# Altium integrated library 基地库.IntLib: 127 symbols
Pins are listed as number, name and electrical type; pins without a type are passive.

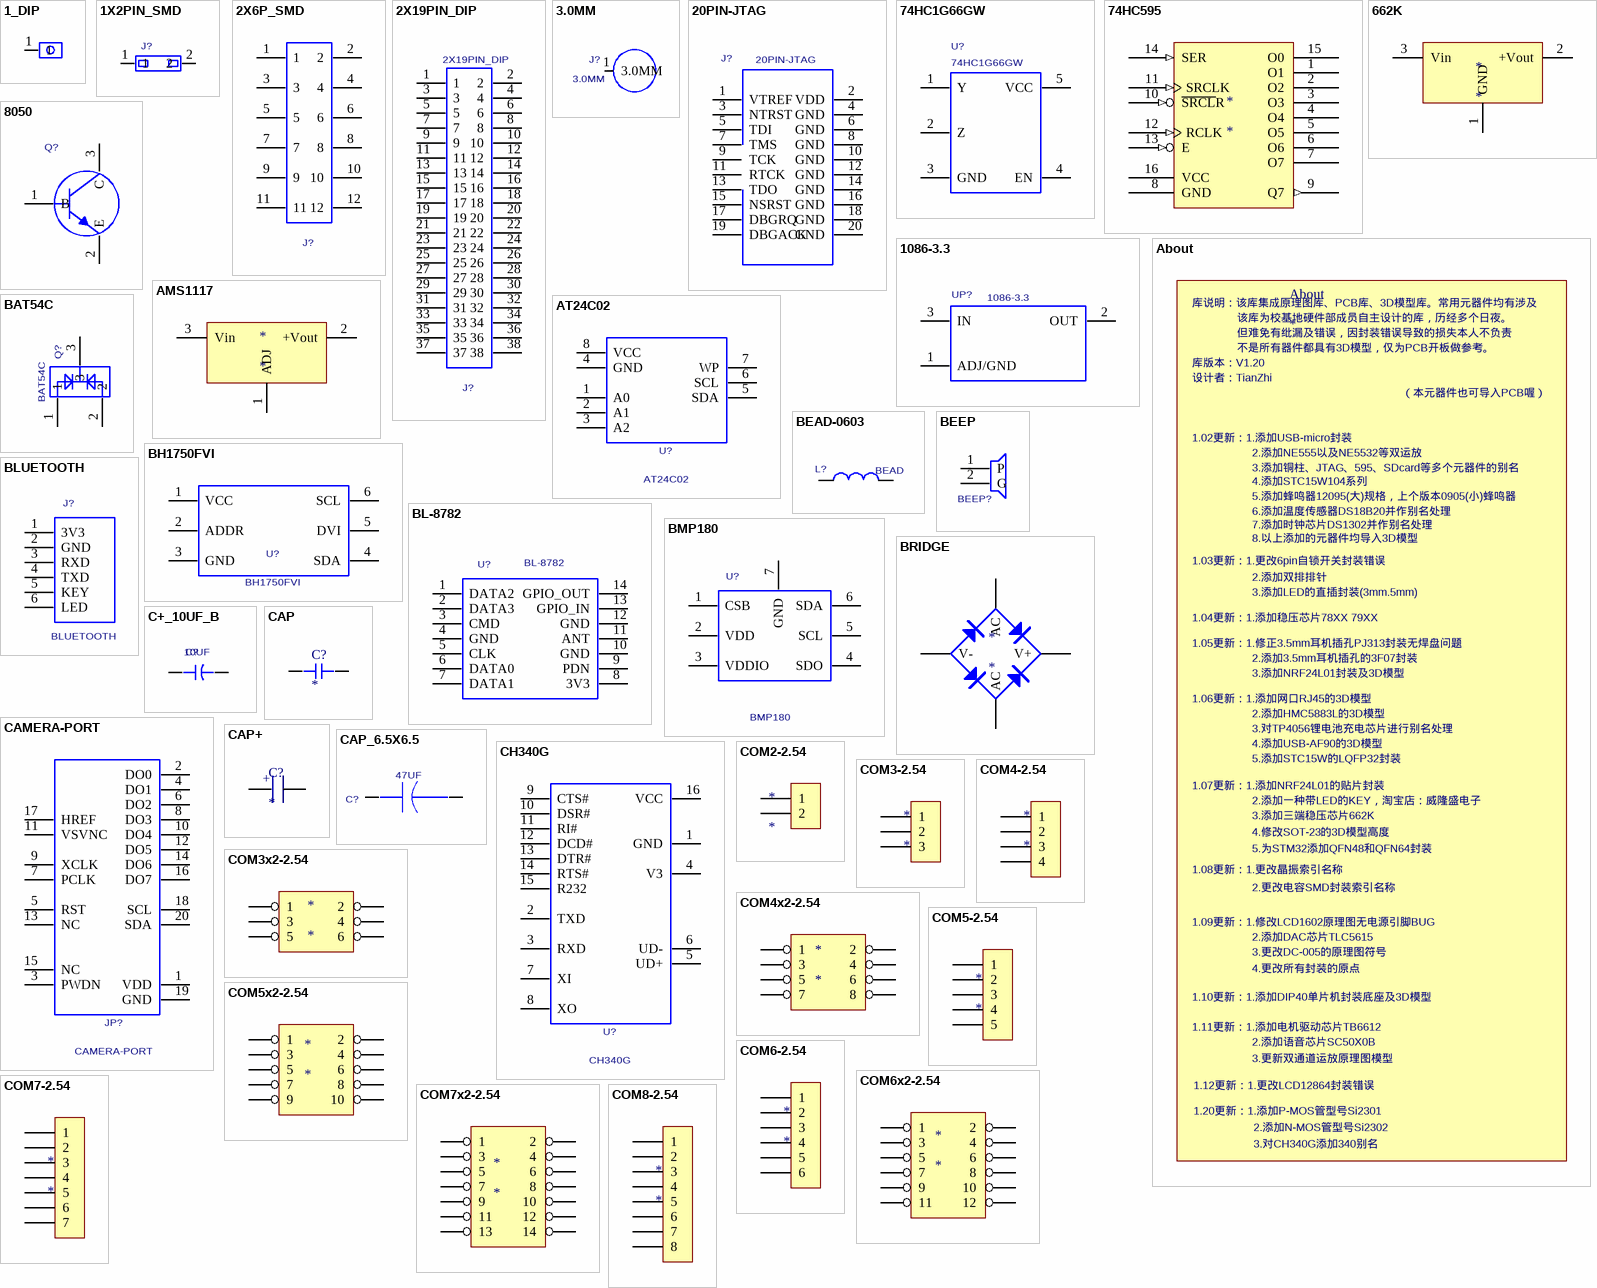
[diagram p0: symbols 1_DIP to COM8-2.54]

## 1_DIP
designator J?  (value not drawn)
PCB DECAL: 1_DIP
footprint 1_DIP
pins: 1

## 1X2PIN_SMD
designator J?  (value not drawn)
PCB DECAL: 1X2PIN_SMD
footprint 1X2PIN_SMD
pins: 1, 2

## 2X6P_SMD
designator J?  (value not drawn)
PCB DECAL: 2X6P_SMD
footprint 2X6P_SMD
pins: 1, 2, 3, 4, 5, 6, 7, 8, 9, 10, 11, 12

## 2X19PIN_DIP
designator J?
PCB DECAL: 2X19X2.54MM
footprint 2X19X2.54MM
pins: 1, 2, 3, 4, 5, 6, 7, 8, 9, 10, 11, 12, 13, 14, 15, 16, 17, 18, 19, 20, 21, 22, 23, 24, 25, 26, 27, 28, 29, 30, 31, 32, 33, 34, 35, 36, 37, 38

## 3.0MM
designator J?
PCB DECAL: 3.0MM
footprint 3.0MM
pins: 1 3.0MM

## 20PIN-JTAG
designator J?
PCB DECAL: 20PIN-JTAG
footprint 20PIN-JTAG
pins: 1 VTREF, 2 VDD, 3 NTRST, 4 GND, 5 TDI, 6 GND, 7 TMS, 8 GND, 9 TCK, 10 GND, 11 RTCK, 12 GND, 13 TDO, 14 GND, 15 NSRST, 16 GND, 17 DBGRQ, 18 GND, 19 DBGACK, 20 GND

## 74HC1G66GW
designator U?
PCB DECAL: SOT-353
footprint SOT-353
pins: 1 Y, 2 Z, 3 GND, 4 EN, 5 VCC

## 74HC595
designator *
footprint SOP16
footprint DIP16
pins: 1 O1 (hiz), 2 O2 (hiz), 3 O3 (hiz), 4 O4 (hiz), 5 O5 (hiz), 6 O6 (hiz), 7 O7 (hiz), 8 GND (hiz), 9 Q7 (out), 10 ~{SRCL}R (in), 11 SRCLK (in), 12 RCLK (in), 13 E (in), 14 SER (in), 15 O0 (hiz), 16 VCC (hiz)

## 662K
designator *
footprint SOT-23
pins: 1 GND, 2 +Vout, 3 Vin

## 1086-3.3
designator UP?
Manufacturer #1: AMS; PCB DECAL: TO-252-2L; Manufacturer #1 PN: 1086-3.3
footprint TO-252-2L
pins: 1 ADJ/GND, 2 OUT, 3 IN

## 8050
designator Q?  (value not drawn)
NPN; PCB DECAL: SOT-23; Manufacturer #2: 8050
footprint SOT-23
pins: 1 B, 2 E, 3 C

## About
designator About
footprint About
text: 库说明：该库集成原理图库、PCB库、3D模型库。常用元器件均有涉及; 该库为校基地硬件部成员自主设计的库，历经多个日夜。; 但难免有纰漏及错误，因封装错误导致的损失本人不负责; 不是所有器件都具有3D模型，仅为PCB开板做参考。; 库版本：V1.20; 设计者：TianZhi; （本元器件也可导入PCB喔）; 1.02更新：1.添加USB-micro封装; 2.添加NE555以及NE5532等双运放; 3.添加铜柱、JTAG、595、SDcard等多个元器件的别名; 4.添加STC15W104系列; 5.添加蜂鸣器12095(大)规格，上个版本0905(小)蜂鸣器; 6.添加温度传感器DS18B20并作别名处理; 7.添加时钟芯片DS1302并作别名处理; 8.以上添加的元器件均导入3D模型; 1.03更新：1.更改6pin自锁开关封装错误; 2.添加双排排针; 3.添加LED的直插封装(3mm.5mm); 1.04更新：1.添加稳压芯片78XX 79XX; 1.05更新：1.修正3.5mm耳机插孔PJ313封装无焊盘问题; 2.添加3.5mm耳机插孔的3F07封装; 3.添加NRF24L01封装及3D模型; 1.06更新：1.添加网口RJ45的3D模型; 2.添加HMC5883L的3D模型; 3.对TP4056锂电池充电芯片进行别名处理; 4.添加USB-AF90的3D模型; 5.添加STC15W的LQFP32封装; 1.07更新：1.添加NRF24L01的贴片封装; 2.添加一种带LED的KEY，淘宝店：威隆盛电子; 3.添加三端稳压芯片662K; 4.修改SOT-23的3D模型高度; 5.为STM32添加QFN48和QFN64封装; 1.08更新：1.更改晶振索引名称; 2.更改电容SMD封装索引名称; 1.09更新：1.修改LCD1602原理图无电源引脚BUG; 2.添加DAC芯片TLC5615; 3.更改DC-005的原理图符号; 4.更改所有封装的原点; 1.10更新：1.添加DIP40单片机封装底座及3D模型; 1.11更新：1.添加电机驱动芯片TB6612; 2.添加语音芯片SC50X0B; 3.更新双通道运放原理图模型; 1.12更新：1.更改LCD12864封装错误; 1.20更新：1.添加P-MOS管型号Si2301; 2.添加N-MOS管型号Si2302; 3.对CH340G添加340别名

## AMS1117
designator *
footprint SOT-223
footprint TO-220L
footprint TO-220H
pins: 1 ADJ, 2 +Vout, 3 Vin

## AT24C02
designator U?
PCB DECAL: SOP8
footprint SOP8
pins: 1 A0, 2 A1, 3 A2, 4 GND, 5 SDA, 6 SCL, 7 WP, 8 VCC

## BAT54C
designator Q?
PCB DECAL: SOT-23; Value: BAT54C
footprint SOT-23
pins: 1, 2, 3

## BEAD-0603
designator L?  value BEAD  (hidden comment: BEAD-0603)
PCB DECAL: R_0603
footprint R_0603
pins: 1, 2

## BEEP
designator BEEP?  (value not drawn)
PCB DECAL: BEEP-9.5X5.5
footprint BEEP-9.5X5.5
footprint BEEP-12.0X9.5
pins: 1 P, 2 G

## BH1750FVI
designator U?
PCB DECAL: WSOF6I; Value: BH1750FVI
footprint WSOF6I
pins: 1 VCC, 2 ADDR, 3 GND, 4 SDA, 5 DVI, 6 SCL

## BL-8782
designator U?
Value: HC-05; PCB DECAL: BL-8782
footprint BL-8782
pins: 1 DATA2, 2 DATA3, 3 CMD, 4 GND, 5 CLK, 6 DATA0, 7 DATA1, 8 3V3, 9 PDN, 10 GND, 11 ANT, 12 GND, 13 GPIO_IN, 14 GPIO_OUT

## BLUETOOTH
designator J?
PCB DECAL: DIP_6_2.54
footprint DIP_6_2.54
pins: 1 3V3, 2 GND, 3 RXD, 4 TXD, 5 KEY, 6 LED

## BMP180
designator U?
Value: BMP180; PCB DECAL: BMP180
footprint BMP180
pins: 1 CSB, 2 VDD, 3 VDDIO, 4 SDO, 5 SCL, 6 SDA, 7 GND

## BRIDGE
designator *
footprint WOB
footprint D37
pins: + V+, - V-, AC1 AC, AC2 AC

## C+_10UF_B
designator C?  value 10UF  (hidden comment: C+_10UF_B)
PCB DECAL: AVX_B_3528-21
footprint AVX_B_3528-21
pins: 1 +, 2 -

## CAMERA-PORT
designator JP?
PCB DECAL: 20PIN_2.54_DIP_BOT; Manufacture 1 P/N: CAMERA-PORT
footprint 20PIN_2.54_DIP_BOT
pins: 1 VDD, 2 DO0, 3 PWDN, 4 DO1, 5 RST, 6 DO2, 7 PCLK, 8 DO3, 9 XCLK, 10 DO4, 11 VSVNC, 12 DO5, 13 NC, 14 DO6, 15 NC, 16 DO7, 17 HREF, 18 SCL, 19 GND, 20 SDA

## CAP
designator C?
footprint C_0603
footprint C_0805
pins: 1, 2

## CAP+
designator C?
footprint CAP_1
footprint CAP_2
footprint CAP_3
footprint CAP_4
footprint CAP_5
footprint CAP_6
footprint CAP_7
pins: 1, 2
text: +

## CAP_6.5X6.5
designator C?  value 47UF  (hidden comment: CAP_6.5X6.5)
PCB DECAL: EC_47UF_6.5X6.5
footprint EC_6.5X6.5
pins: 1, 2

## CH340G
designator U?
PCB DECAL: SOP16
footprint SOP16
pins: 1 GND, 2 TXD, 3 RXD, 4 V3, 5 UD+, 6 UD-, 7 XI, 8 XO, 9 CTS#, 10 DSR#, 11 RI#, 12 DCD#, 13 DTR#, 14 RTS#, 15 R232, 16 VCC

## COM2-2.54
designator *
footprint COM2-2.54
pins: 1, 2

## COM3-2.54
designator *
footprint COM3-2.54
pins: 1, 2, 3

## COM3x2-2.54
designator *
footprint COM3X2-2.54
pins: 1, 2, 3, 4, 5, 6

## COM4-2.54
designator *
footprint COM4-2.54
pins: 1, 2, 3, 4

## COM4x2-2.54
designator *
footprint COM4X2-2.54
pins: 1, 2, 3, 4, 5, 6, 7, 8

## COM5-2.54
designator *
footprint COM5-2.54
pins: 1, 2, 3, 4, 5

## COM5x2-2.54
designator *
footprint COM5X2-2.54
pins: 1, 2, 3, 4, 5, 6, 7, 8, 9, 10

## COM6-2.54
designator *
footprint COM6-2.54
pins: 1, 2, 3, 4, 5, 6

## COM6x2-2.54
designator *
footprint COM6X2-2.54
pins: 1, 2, 3, 4, 5, 6, 7, 8, 9, 10, 11, 12

## COM7-2.54
designator *
footprint COM7-2.54
pins: 1, 2, 3, 4, 5, 6, 7

## COM7x2-2.54
designator *
footprint COM7X2-2.54
pins: 1, 2, 3, 4, 5, 6, 7, 8, 9, 10, 11, 12, 13, 14

## COM8-2.54
designator *
footprint COM8-2.54
pins: 1, 2, 3, 4, 5, 6, 7, 8

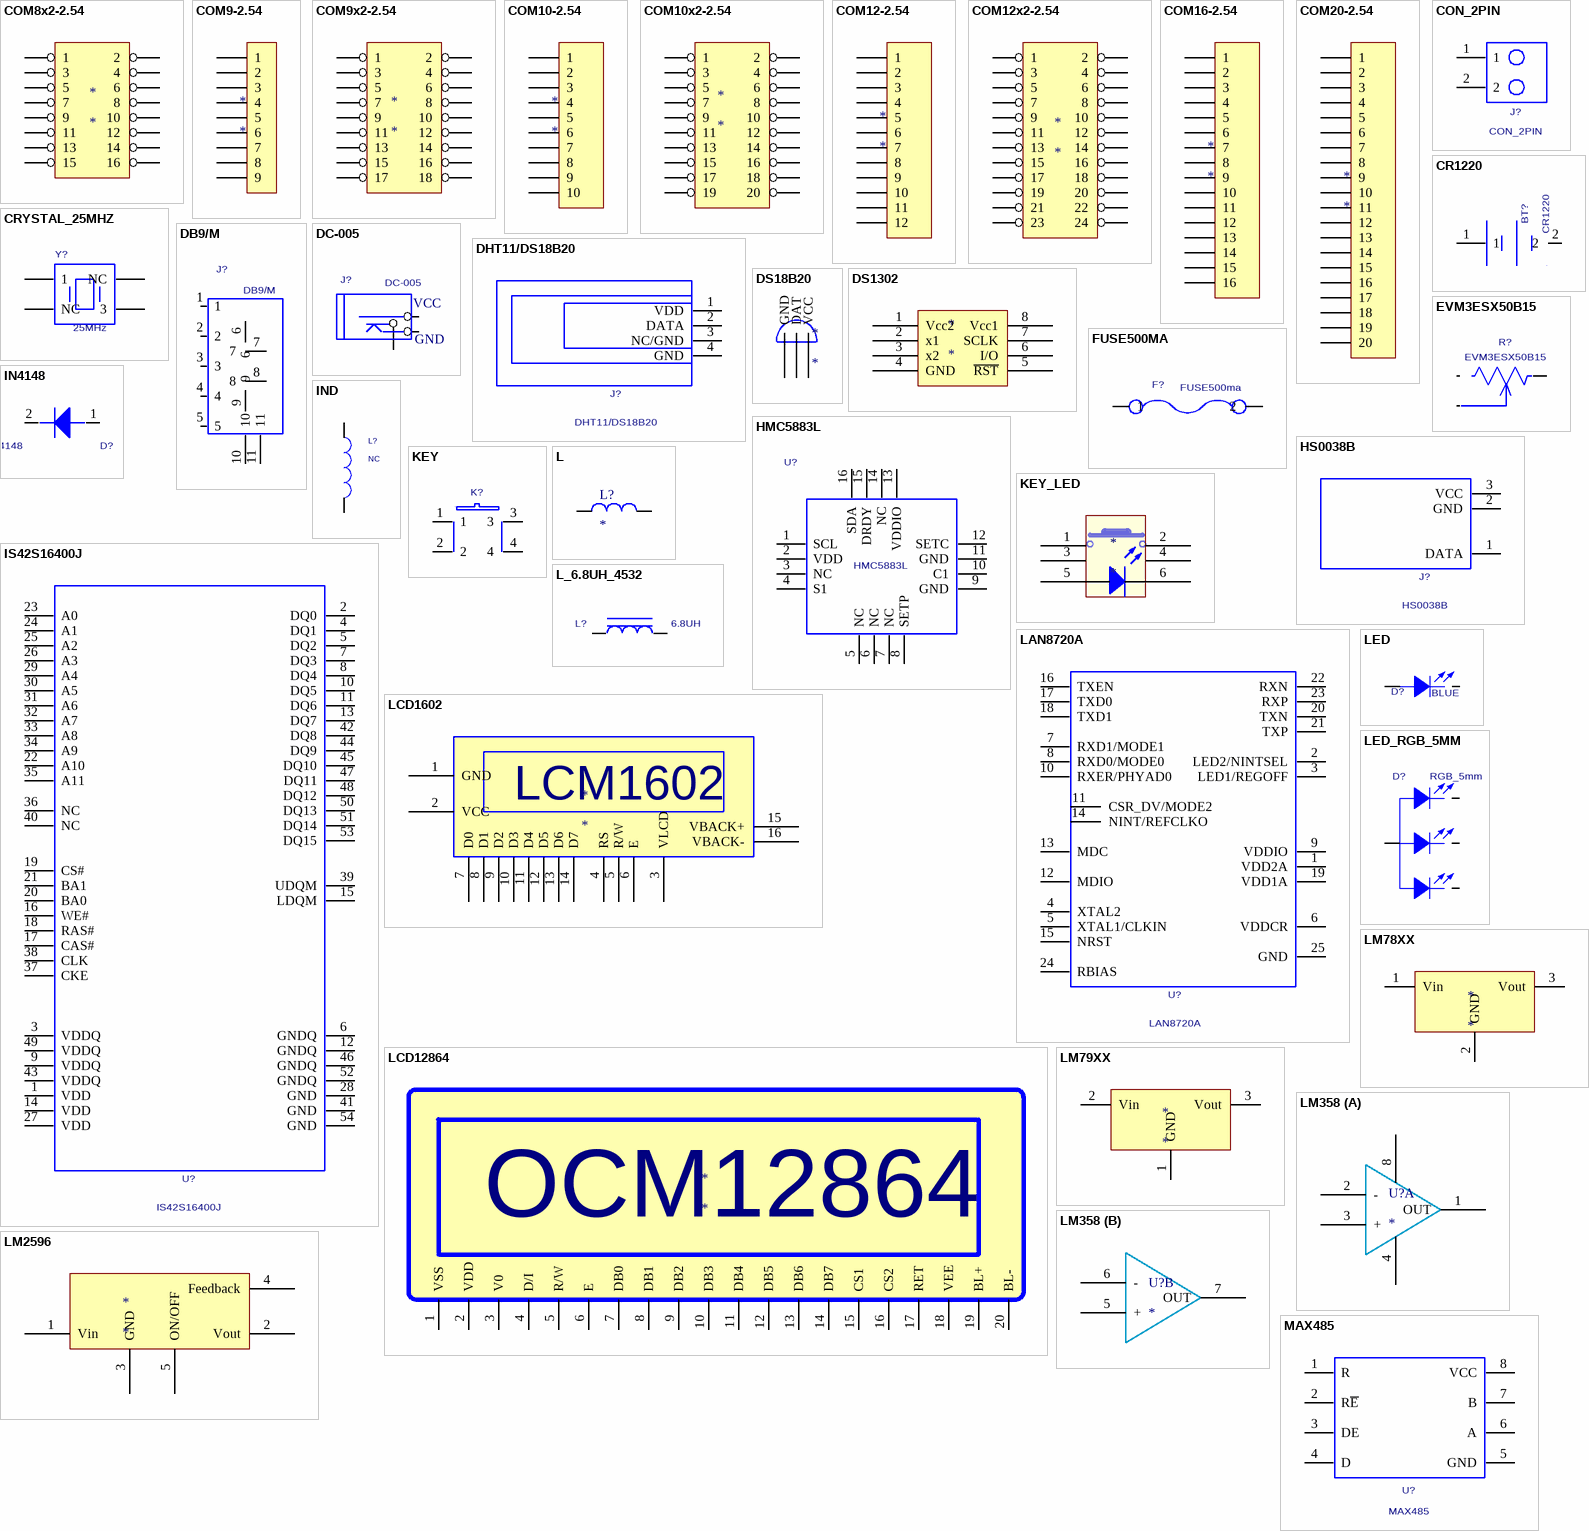
[diagram p1: symbols COM8x2-2.54 to MAX485]

## COM8x2-2.54
designator *
footprint COM8X2-2.54
pins: 1, 2, 3, 4, 5, 6, 7, 8, 9, 10, 11, 12, 13, 14, 15, 16

## COM9-2.54
designator *
footprint COM9-2.54
pins: 1, 2, 3, 4, 5, 6, 7, 8, 9

## COM9x2-2.54
designator *
footprint COM9X2-2.54
pins: 1, 2, 3, 4, 5, 6, 7, 8, 9, 10, 11, 12, 13, 14, 15, 16, 17, 18

## COM10-2.54
designator *
footprint COM10-2.54
pins: 1, 2, 3, 4, 5, 6, 7, 8, 9, 10

## COM10x2-2.54
designator *
footprint COM10X2-2.54
pins: 1, 2, 3, 4, 5, 6, 7, 8, 9, 10, 11, 12, 13, 14, 15, 16, 17, 18, 19, 20

## COM12-2.54
designator *
footprint COM12-2.54
pins: 1, 2, 3, 4, 5, 6, 7, 8, 9, 10, 11, 12

## COM12x2-2.54
designator *
footprint COM12X2-2.54
pins: 1, 2, 3, 4, 5, 6, 7, 8, 9, 10, 11, 12, 13, 14, 15, 16, 17, 18, 19, 20, 21, 22, 23, 24

## COM16-2.54
designator *
footprint COM16-2.54
pins: 1, 2, 3, 4, 5, 6, 7, 8, 9, 10, 11, 12, 13, 14, 15, 16

## COM20-2.54
designator *
footprint COM20-2.54
pins: 1, 2, 3, 4, 5, 6, 7, 8, 9, 10, 11, 12, 13, 14, 15, 16, 17, 18, 19, 20

## CON_2PIN
designator J?
PCB DECAL: CON_2PIN
footprint CON_2PIN
pins: 1, 2

## CR1220
designator BT?
PCB DECAL: BATERY
footprint BATERY
pins: 1, 2

## CRYSTAL_25MHZ
designator Y?  value 25MHz  (hidden comment: CRYSTAL_25MHZ)
PCB DECAL: CRYSTAL_25MHZ
footprint CRYSTAL_25MHZ
pins: 1, 2 NC, 3, 4 NC

## DB9/M
designator J?
PCB DECAL: DB9
footprint DB9
pins: 1, 2, 3, 4, 5, 6, 7, 8, 9, 10, 11

## DC-005
designator J?
PCB DECAL: DC-005
footprint DC-005
pins: 1, 2, 3
text: VCC; GND

## DHT11/DS18B20
designator J?
Manufacture 1 P/N: DHT11/DS1302; PCB DECAL: HDR1X4
footprint HDR1X4
pins: 1 VDD, 2 DATA, 3 NC/GND, 4 GND

## DS18B20
designator *
footprint TO-92
pins: 1 GND, 2 DAT, 3 VCC

## DS1302
designator *
footprint SOP8
footprint DIP8
pins: 1 Vcc2, 2 x1, 3 x2, 4 GND, 5 ~{RST}, 6 I/O, 7 SCLK, 8 Vcc1

## EVM3ESX50B15
designator R?
c; Value: EVM3ESX50B15-100K; PCB DECAL: R-3X3
footprint R-3X3
pins: 1, 2, 3

## FUSE500MA
designator F?
Assembly: SMD; PCB DECAL: C1812; Manufacture 1 P/N: FUSE500ma; Value: FUSE500ma
footprint C1812
pins: 1, 2

## HMC5883L
designator U?
PCB DECAL: LPCC-16; Value: HMC5883L
footprint LPCC-16
pins: 1 SCL, 2 VDD, 3 NC, 4 S1, 5 NC, 6 NC, 7 NC, 8 SETP, 9 GND, 10 C1, 11 GND, 12 SETC, 13 VDDIO, 14 NC, 15 DRDY, 16 SDA

## HS0038B
designator J?
PCB DECAL: HDR1X3; Manufacture 1 P/N: HS0038B
footprint HDR1X3
pins: 1 DATA, 2 GND, 3 VCC

## IN4148
designator D?
PCB DECAL: DIODE_SOP; VALUE: IN4148
footprint DIODE_SOP
pins: 1 +, 2 -

## IND
designator L?  value NC  (hidden comment: IND)
1uH, 1.1R@245MHz, 245mA; Partname: 贴片电感; Mfr: TDK; Mfr_Part_Number: NLV25T-1R0J-PF; Part_Number: IN100085-01; PCB DECAL: R_0603; Spec: 1uH,NLV25T-1R0J-PF(TDK); Tolerance: 5%; Resistance: 1.1R; Source_Path: D:\CADENCELIB\CAPTURELIB\LC_PASSIVE.OLB; Current: 245mA; Availability: 0
footprint R_0603
pins: 1, 2

## IS42S16400J
designator U?
PCB DECAL: TSOP-54
footprint TSOP-54
pins: 1 VDD, 2 DQ0, 3 VDDQ, 4 DQ1, 5 DQ2, 6 GNDQ, 7 DQ3, 8 DQ4, 9 VDDQ, 10 DQ5, 11 DQ6, 12 GNDQ, 13 DQ7, 14 VDD, 15 LDQM, 16 WE#, 17 CAS#, 18 RAS#, 19 CS#, 20 BA0, 21 BA1, 22 A10, 23 A0, 24 A1, 25 A2, 26 A3, 27 VDD, 28 GND, 29 A4, 30 A5, 31 A6, 32 A7, 33 A8, 34 A9, 35 A11, 36 NC, 37 CKE, 38 CLK, 39 UDQM, 40 NC, 41 GND, 42 DQ8, 43 VDDQ, 44 DQ9, 45 DQ10, 46 GNDQ, 47 DQ11, 48 DQ12, 49 VDDQ, 50 DQ13, 51 DQ14, 52 GNDQ, 53 DQ15, 54 GND

## KEY
designator K?  (value not drawn)
PCB DECAL: SW6.2/6.2-SMD; Manufacturer #1 PN: KEY
footprint SW6.2/6.2-SMD
pins: 1, 2, 3, 4

## KEY_LED
designator *
footprint KEY_LED
pins: 1, 2, 3, 4, 5, 6

## L
designator L?
footprint L-0603
footprint CD127
pins: 1, 2

## L_6.8UH_4532
designator L?  value 6.8UH  (hidden comment: L_6.8UH_4532)
PCB DECAL: GDCD4532
footprint GDCD4532
pins: 1, 2

## LAN8720A
designator U?
PCB DECAL: QFN24
footprint QFN24
pins: 1 VDD2A, 2 LED2/NINTSEL, 3 LED1/REGOFF, 4 XTAL2, 5 XTAL1/CLKIN, 6 VDDCR, 7 RXD1/MODE1, 8 RXD0/MODE0, 9 VDDIO, 10 RXER/PHYAD0, 11 CSR_DV/MODE2, 12 MDIO, 13 MDC, 14 NINT/REFCLKO, 15 NRST, 16 TXEN, 17 TXD0, 18 TXD1, 19 VDD1A, 20 TXN, 21 TXP, 22 RXN, 23 RXP, 24 RBIAS, 25 GND

## LCD1602
designator *
footprint LCD1602
pins: 1 GND, 2 VCC, 3 VLCD, 4 RS, 5 R/W, 6 E, 7 D0, 8 D1, 9 D2, 10 D3, 11 D4, 12 D5, 13 D6, 14 D7, 15 VBACK+, 16 VBACK-
text: LCM1602

## LCD12864
designator *
footprint LCD12864
pins: 1 VSS, 2 VDD, 3 V0, 4 D/I, 5 R/W, 6 E, 7 DB0, 8 DB1, 9 DB2, 10 DB3, 11 DB4, 12 DB5, 13 DB6, 14 DB7, 15 CS1, 16 CS2, 17 RET, 18 VEE, 19 BL+, 20 BL-
text: OCM12864

## LED
designator D?  value BLUE  (hidden comment: LED)
PCB DECAL: LED_0603
footprint LED_0603
footprint LED_3MM
footprint LED_5MM
footprint LED_0805
pins: 1 ANODE, 2 CATHODE

## LED_RGB_5MM
designator D?  value RGB_5mm  (hidden comment: LED_RGB_5MM)
RGB; PCB DECAL: LED_RGB_5MM
footprint LED_RGB_5MM
pins: 1 G, 2 G, 3 R, 4 R

## LM78XX
designator *
footprint TO-220H
footprint TO-220L
footprint TO-252-2L
pins: 1 Vin, 2 GND, 3 Vout

## LM79XX
designator *
footprint TO-220H
footprint TO-220L
footprint TO-252-2L
pins: 1 GND, 2 Vin, 3 Vout

## LM358
designator U?
footprint SOP8
footprint DIP8
part A pins: 1 OUT, 2 -, 3 +, 4 -VCC, 8 VCC
part B pins: 5 +, 6 -, 7 OUT

## LM2596
designator *
footprint TO-263-5
pins: 1 Vin, 2 Vout, 3 GND, 4 Feedback, 5 ON/OFF

## MAX485
designator U?
PCB DECAL: MAX485
footprint SOP8
pins: 1 R, 2 R~{E}, 3 DE, 4 D, 5 GND, 6 A, 7 B, 8 VCC

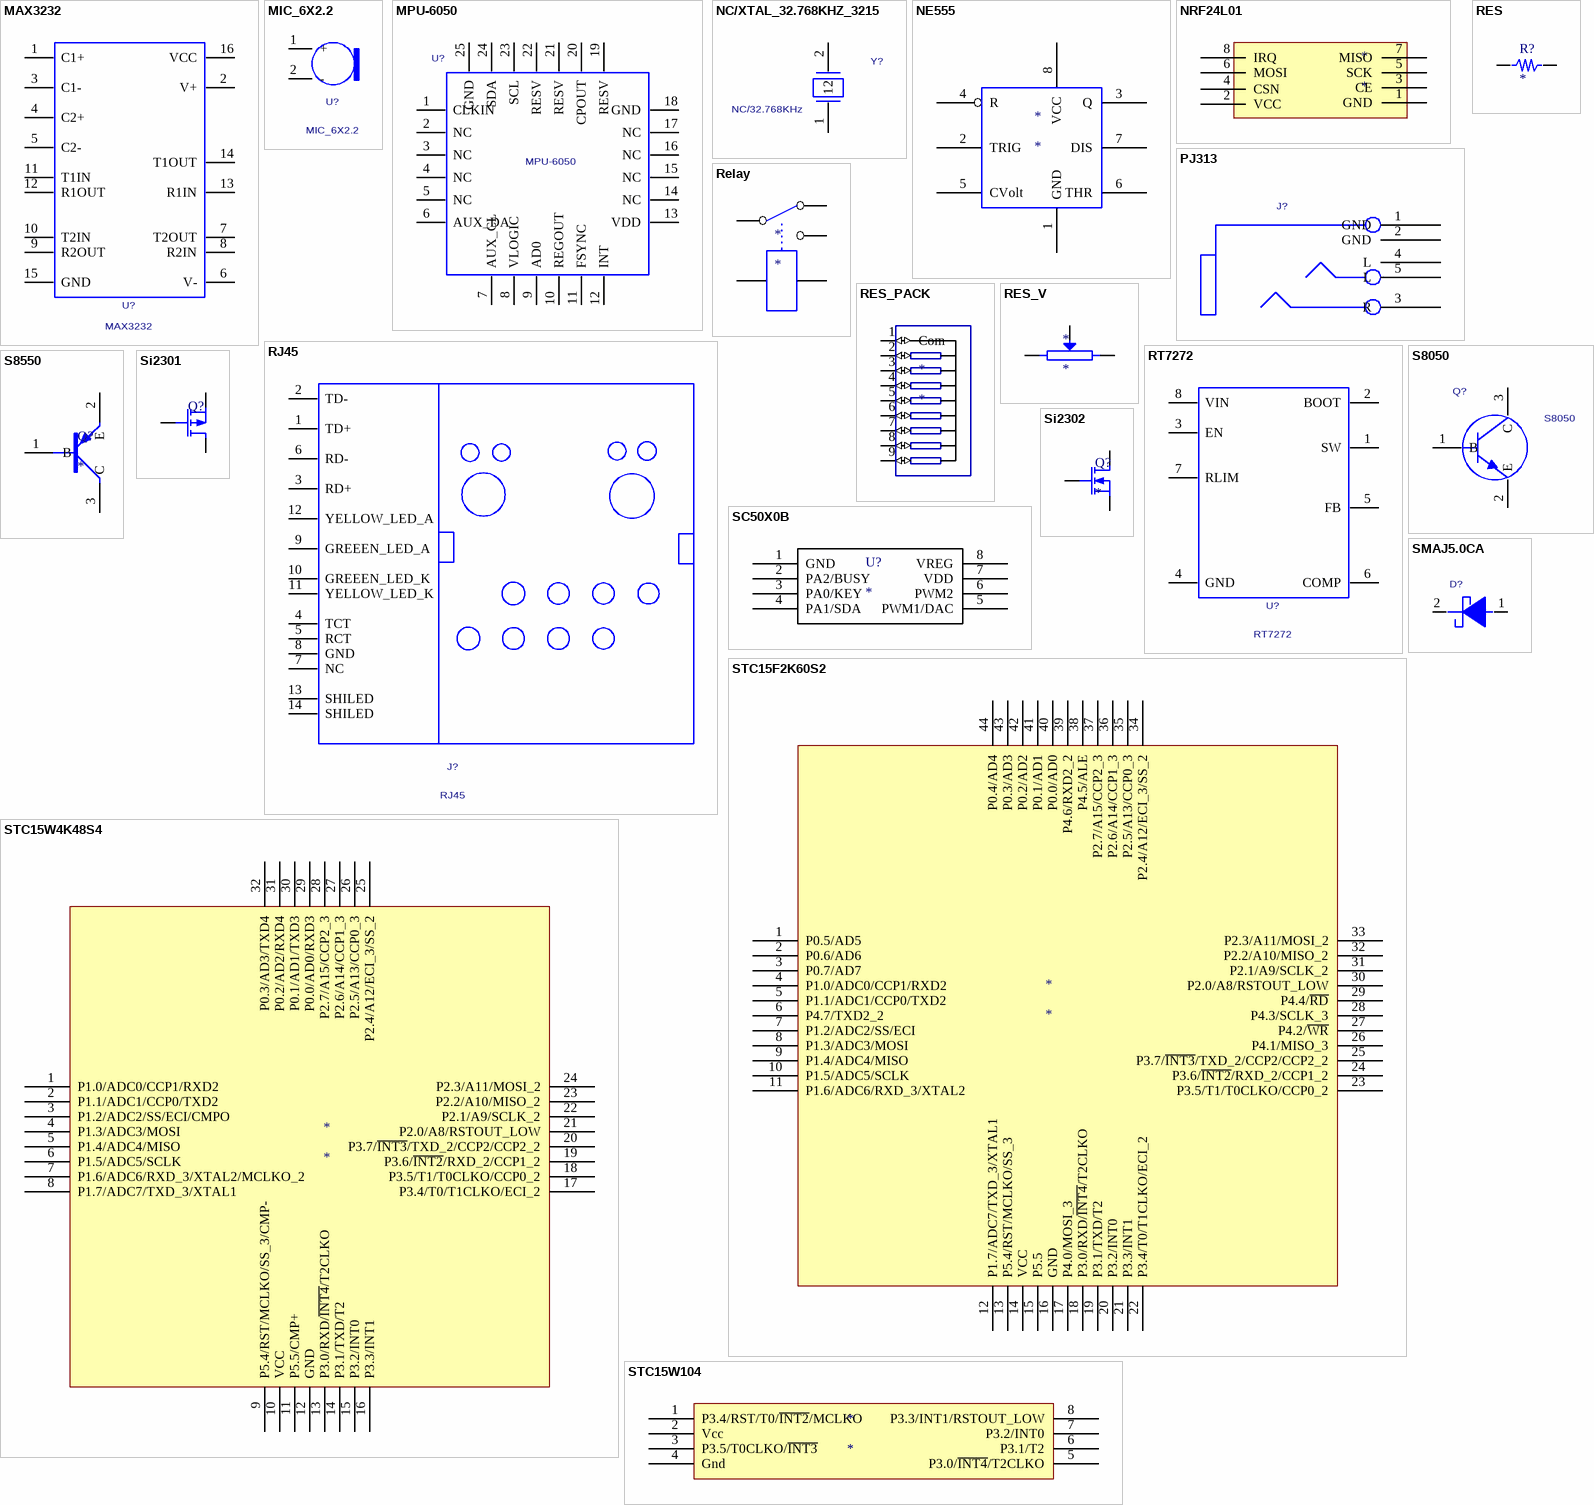
[diagram p2: symbols MAX3232 to STC15W104]

## MAX3232
designator U?
PCB DECAL: MAX3232
footprint SOP16
pins: 1 C1+, 2 V+, 3 C1-, 4 C2+, 5 C2-, 6 V-, 7 T2OUT, 8 R2IN, 9 R2OUT, 10 T2IN, 11 T1IN, 12 R1OUT, 13 R1IN, 14 T1OUT, 15 GND, 16 VCC

## MIC_6X2.2
designator U?
PCB DECAL: MIC_6X2.2
footprint MIC_6X2.2
pins: 1 +, 2 -

## MPU-6050
designator U?
PCB DECAL: QFN24; Value: MPU-6050
footprint QFN24
pins: 1 CLKIN, 2 NC, 3 NC, 4 NC, 5 NC, 6 AUX_DA, 7 AUX_CL, 8 VLOGIC, 9 AD0, 10 REGOUT, 11 FSYNC, 12 INT, 13 VDD, 14 NC, 15 NC, 16 NC, 17 NC, 18 GND, 19 RESV, 20 CPOUT, 21 RESV, 22 RESV, 23 SCL, 24 SDA, 25 GND

## NC/XTAL_32.768KHZ_3215
designator Y?  value NC/32.768KHz  (hidden comment: NC/XTAL_32.768KHZ_3215)
CRYSTAL; PCB DECAL: 3215
footprint 3215
pins: 1, 2

## NE555
designator *
footprint SOP8
footprint DIP8
pins: 1 GND, 2 TRIG, 3 Q, 4 R, 5 CVolt, 6 THR, 7 DIS, 8 VCC

## NRF24L01
designator *
footprint NRF24L01_A
footprint NRF24L01_B
pins: 1 GND, 2 VCC, 3 CE, 4 CSN, 5 SCK, 6 MOSI, 7 MISO, 8 IRQ

## PJ313
designator J?
Manufacturer #1 PN: PJ-313D; Value: PJ-313D; PCB DECAL: PJ-3001S
footprint PJ-313
footprint 3F07; pin to pad 2>1 5>4
pins: 1 GND, 2 GND, 3 R, 4 L, 5 L

## Relay
designator *
footprint Relay-1
pins: 1, 2, 3, 4, 5

## RES
designator R?
footprint R_0603
footprint R_0805
footprint AXIAL0.3
footprint AXIAL0.4
footprint AXIAL0.5
footprint AXIAL0.6
footprint AXIAL0.7
footprint AXIAL0.8
footprint AXIAL0.9
footprint AXIAL1.0
pins: 1, 2

## RES_PACK
designator *
footprint ResPack
pins: 1 Com (io), 2 (io), 3 (io), 4 (io), 5 (io), 6 (io), 7 (io), 8 (io), 9 (io)

## RES_V
designator *
footprint RES_V1
footprint RES_V2
footprint RES_V3
footprint RES_V4
footprint RES_V5
footprint RES_V6
pins: 4, 5 W, 6

## RJ45
designator J?
PCB DECAL: RJ45
footprint RJ45
pins: 1 TD+, 2 TD-, 3 RD+, 4 TCT, 5 RCT, 6 RD-, 7 NC, 8 GND, 9 GREEEN_LED_A, 10 GREEEN_LED_K, 11 YELLOW_LED_K, 12 YELLOW_LED_A, 13 SHILED, 14 SHILED

## RT7272
designator U?
PCB DECAL: RT7272
footprint SOP8
pins: 1 SW, 2 BOOT, 3 EN, 4 GND, 5 FB, 6 COMP, 7 RLIM, 8 VIN